# Altium footprint library Connectors.PcbLib: 60 footprints (part 3 of 4)
Each footprint in its own frame and in the unit in brackets; x right, y up, seen from the top. Pads: shape width x height; smd on the part's side, far side on the other; paste and mask are expansions set on the pad; w line width, h text height; cw(c..) or ccw(c..) is an arc to the next point about the centre after c.
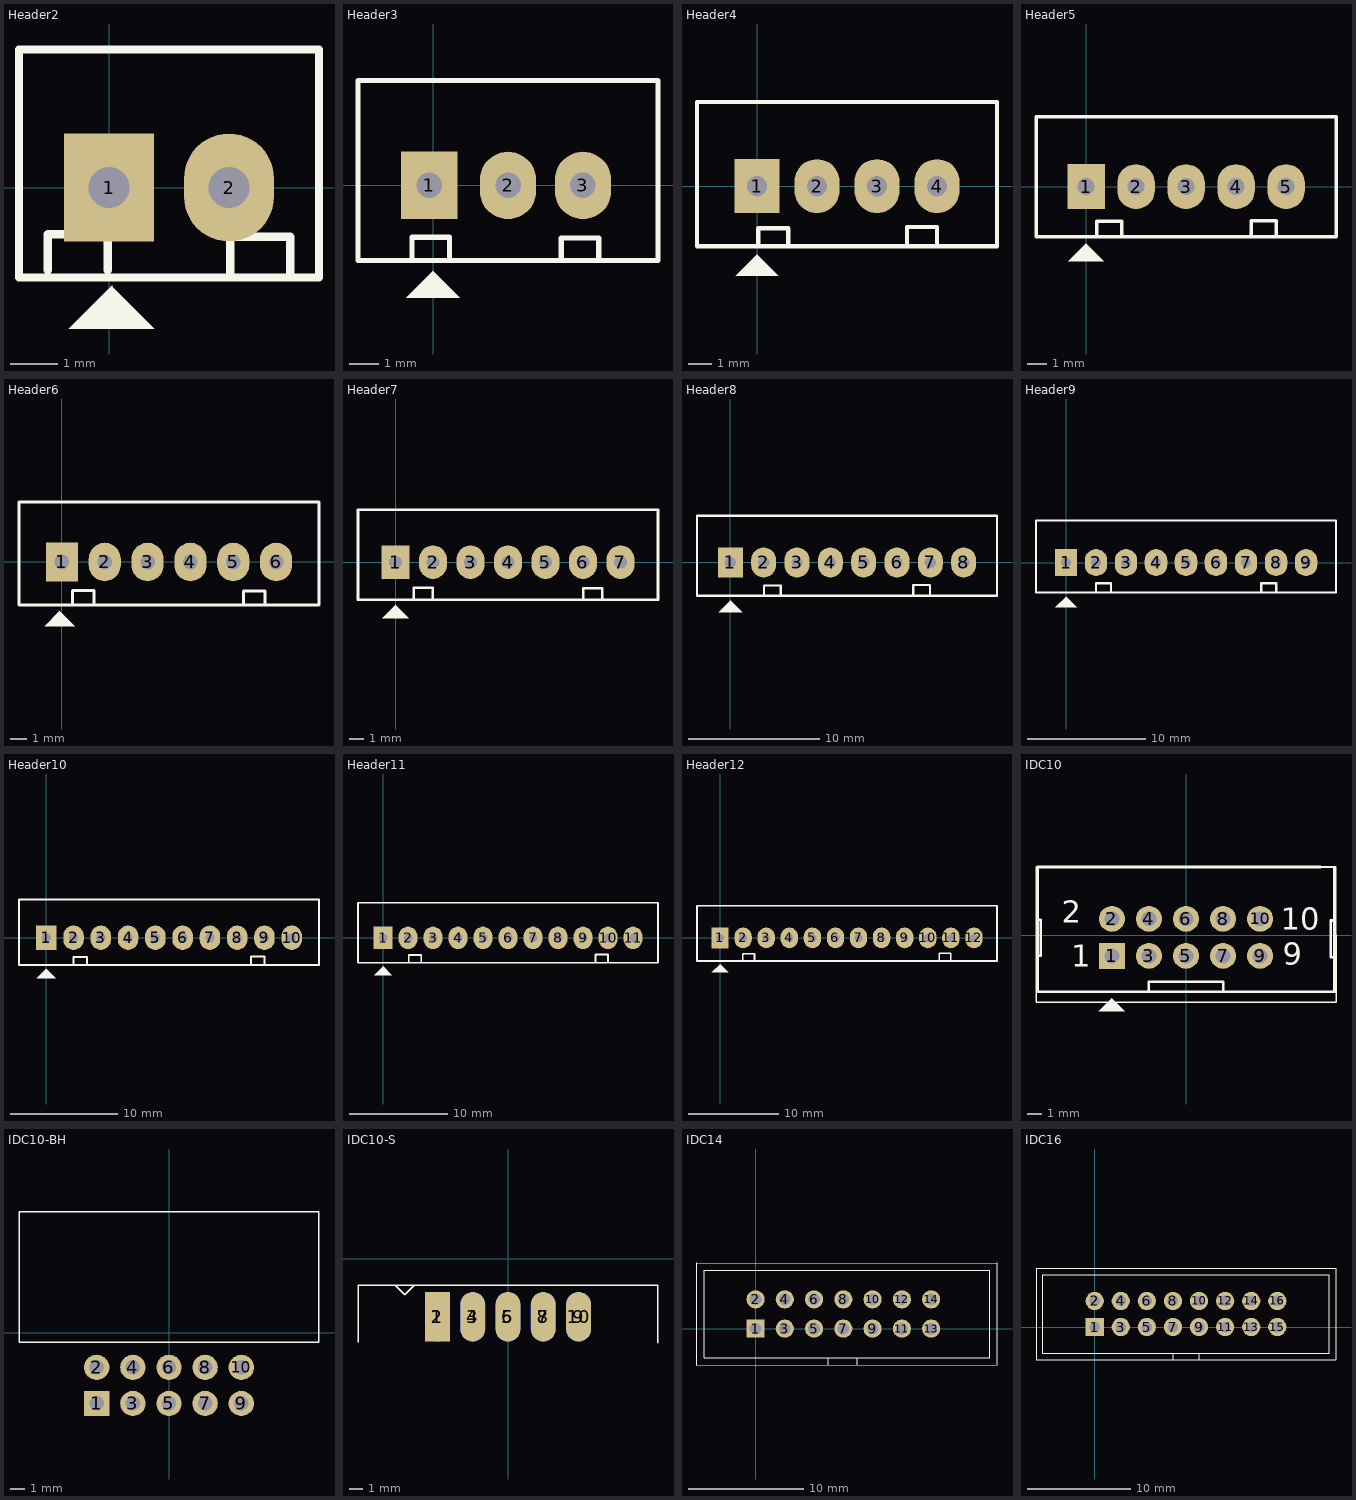
[diagram p2: the footprints below, top view; thin cyan lines are the x and y axes]

## Header2 [mil] "CON2"
height 200
pads (2):
  rect 75x90 hole 34: 1(0,0)
  oval 75x90 hole 34: 2(100,0)
Top Overlay:
  region: -33.5,-117.5 37.5,-117.5 2.5,-82.5 2.5,-81.5
  lines w7: -51,-69 -51,-39 -1,-39 -1,-69 ; 101,-71 101,-41 151,-41 151,-71 ; -75,-75 175,-75 175,115 -75,115 -75,-75
3D body "User Library-PCB HEADER (JST BxB-PH-K-S (VERTICAL)).STEP": height 236.22, standoff -75, extent -68.11,-70 168.11,107.17

## Header3 [mil] "CON 3"
height 200
pads (3):
  rect 75x90 hole 34: 1(-5,0)
  oval 75x90 hole 34: 2(100,0) 3(200,0)
Top Overlay:
  region: -35.5,-149.5 35.5,-149.5 0.5,-114.5 0.5,-113.5
  lines w7: -28,-99 -28,-69 22,-69 22,-99 ; 171,-100 171,-70 221,-70 221,-100 ; -100,-100 300,-100 300,0 300,140 -100,140 -100,-100
3D body "SW3dPS-jst-b3b-xh-a.STEP": height 275.59, standoff -133.86, extent -94.88,-90 294.88,136.38

## Header4 [mil] "CON4"
height 200
pads (4):
  rect 75x90 hole 34: 1(0,0)
  oval 75x90 hole 34: 2(100,0) 3(200,0) 4(300,0)
Top Overlay:
  region: -35.5,-149.5 35.5,-149.5 0.5,-114.5 0.5,-113.5
  lines w7: 2,-100 2,-70 52,-70 52,-100 ; 250,-98 250,-68 300,-68 300,-98 ; -100,-100 400,-100 400,0 400,140 -100,140 -100,-100
3D body "User Library-HEADER,JST,BxB-XH-A.STEP": height 275.59, standoff -133.86, extent -90,-90 398.19,136.38

## Header5 [mil] "CON5"
height 200
pads (5):
  rect 75x90 hole 34: 1(0,0)
  oval 75x90 hole 34: 2(100,0) 3(200,0) 4(300,0) 5(400,0)
Top Overlay:
  region: -35.5,-149.5 35.5,-149.5 0.5,-114.5 0.5,-113.5
  lines w7: 21,-99 21,-69 71,-69 71,-99 ; 330,-98 330,-68 380,-68 380,-98 ; -100,-100 -100,140 500,140 500,0 500,-100 -100,-100

## Header6 [mil] "CON6"
height 200
pads (6):
  rect 75x90 hole 34: 1(0,0)
  oval 75x90 hole 34: 2(100,0) 3(200,0) 4(300,0) 5(400,0) 6(500,0)
Top Overlay:
  region: -40.5,-149.5 30.5,-149.5 -4.5,-114.5 -4.5,-113.5
  lines w7: 25,-97 25,-67 75,-67 75,-97 ; 424,-98 424,-68 474,-68 474,-98 ; -100,-100 -100,140 600,140 600,0 600,-100 -100,-100

## Header7 [mil] "CON7"
height 200
pads (7):
  rect 75x90 hole 34: 1(0,0)
  oval 75x90 hole 34: 2(100,0) 3(200,0) 4(300,0) 5(400,0) 6(500,0) 7(600,0)
Top Overlay:
  region: -35.5,-149.5 35.5,-149.5 0.5,-114.5 0.5,-113.5
  lines w7: 49,-98 49,-68 99,-68 99,-98 ; 501,-99 501,-69 551,-69 551,-99 ; -100,-100 -100,140 700,140 700,0 700,-100 -100,-100

## Header8 [mil] "CON8"
height 200
pads (8):
  rect 75x90 hole 34: 1(0,0)
  oval 75x90 hole 34: 2(100,0) 3(200,0) 4(300,0) 5(400,0) 6(500,0) 7(600,0) 8(700,0)
Top Overlay:
  region: -35.5,-149.5 35.5,-149.5 0.5,-114.5 0.5,-113.5
  lines w7: 101,-99 101,-69 151,-69 151,-99 ; 549,-98 549,-68 599,-68 599,-98 ; -100,-100 800,-100 800,0 800,140 -100,140 -100,-100

## Header9 [mil] "CON9"
height 200
pads (9):
  rect 75x90 hole 34: 1(0,0)
  oval 75x90 hole 34: 2(100,0) 3(200,0) 4(300,0) 5(400,0) 6(500,0) 7(600,0) 8(700,0) 9(800,0)
Top Overlay:
  region: -35.5,-149.5 35.5,-149.5 0.5,-114.5 0.5,-113.5
  lines w7: 100,-99 100,-69 150,-69 150,-99 ; 651,-99 651,-69 701,-69 701,-99 ; -100,-100 -100,140 900,140 900,0 900,-100 -100,-100

## Header10 [mil] "CON10"
height 200
pads (10):
  rect 75x90 hole 34: 1(0,0)
  oval 75x90 hole 34: 2(100,0) 3(200,0) 4(300,0) 5(400,0) 6(500,0) 7(600,0) 8(700,0) 9(800,0) 10(900,0)
Top Overlay:
  region: -35.5,-149.5 35.5,-149.5 0.5,-114.5 0.5,-113.5
  lines w7: 100,-100 100,-70 150,-70 150,-100 ; 750,-99 750,-69 800,-69 800,-99 ; -100,-100 -100,140 1000,140 1000,0 1000,-100 -100,-100

## Header11 [mil] "CON11"
height 200
pads (11):
  rect 75x90 hole 34: 1(0,0)
  oval 75x90 hole 34: 2(100,0) 3(200,0) 4(300,0) 5(400,0) 6(500,0) 7(600,0) 8(700,0) 9(800,0) 10(900,0) 11(1000,0)
Top Overlay:
  region: -35.5,-149.5 35.5,-149.5 0.5,-114.5 0.5,-113.5
  lines w7: 103,-99 103,-69 153,-69 153,-99 ; 850,-97 850,-67 900,-67 900,-97 ; -100,-100 -100,140 1100,140 1100,0 1100,-100 -100,-100

## Header12 [mil] "CON12"
height 200
pads (12):
  rect 75x90 hole 34: 1(0,0)
  oval 75x90 hole 34: 2(100,0) 3(200,0) 4(300,0) 5(400,0) 6(500,0) 7(600,0) 8(700,0) 9(800,0) 10(900,0) 11(1000,0) 12(1100,0)
Top Overlay:
  region: -35.5,-149.5 35.5,-149.5 0.5,-114.5 0.5,-113.5
  lines w7: 99,-99 99,-69 149,-69 149,-99 ; 950,-97 950,-67 1000,-67 1000,-97 ; -100,-100 1200,-100 1200,0 1200,140 -100,140 -100,-100

## IDC10 [mil]
pads (10):
  rect 70x70 hole 40: 1(-200,-55)
  round 70 hole 40: 2(-200,45) 3(-100,-55) 4(-100,45) 5(0,-55) 6(0,45) 7(100,-55) 8(100,45) 9(200,-55) 10(200,45)
Top Overlay:
  region: -200,-170 -235,-205 -165,-205
  lines w4: -405,-180 -405,186 405,186 405,-180 -405,-180
  lines w5: 362.79,185 400,185 400,140 401,140
  lines w7: -400.79,-55.98 -399.8,-55 -391.93,-55 -391.93,42.44 -400.79,42.44 ; -100.59,-151 -100.59,-125 100.2,-125 100.2,-152 ; 398.56,-151.44 401,-149 ; 401,-59 391,-59 391,40.41 401,40.41 ; 402,-152.44 -400.79,-152.44 -400.79,185 ; -400.79,185 362.79,185 -400.79,185 ; 401,-149 401,146 401,-149
  text "10" at 256,16 h60
  text "9" at 261,-79 h60
  text "2" at -335,35 h60
  text "1" at -309.25,-84.53 h60
3D body "User Library-IDC-10M.STEP": height 366.14, standoff -122.05, extent -399.6,-178.23 399.61,180.04

## IDC10-BH [mil]
pads (10):
  rect 70x70 hole 40: 1(-200,-195)
  round 70 hole 40: 2(-200,-95) 3(-100,-195) 4(-100,-95) 5(0,-195) 6(0,-95) 7(100,-195) 8(100,-95) 9(200,-195) 10(200,-95)
Top Overlay:
  lines w4: -415,-25 415,-25 415,335 -415,335 -415,-25
3D body "User Library-IDC Socket Male 10pin Angled THT Goldplated 2_54mm.step": height 353.54, standoff -93.31, extent -412.2,-203.86 412.2,330

## IDC10-S [mil]
pads (10):
  rect 70x140 smd: 1(-200,-165)
  oval 70x140 smd far side: 2(-200,-165) 4(-100,-165) 6(0,-165) 8(100,-165) 10(200,-165)
  oval 70x140 smd: 3(-100,-165) 5(0,-165) 7(100,-165) 9(200,-165)
Top Overlay:
  lines w4: -319,-75 -292,-102 -265,-75 ; -425,-237 -425,-75 425,-75 425,-239 ; -425,-237 -425,-237 ; 425,-239 425,-239
3D body: height 150, standoff -150, extent -424.5,-67.5 425,18
3D body: height 150, standoff 120, extent -425.5,-67.5 425.5,275.5
3D body: height 150, standoff -150, extent -424.5,-67.5 -386,276
3D body: height 150, standoff -150, extent -424.5,-67.5 425,18
3D body: height 150, standoff -150, extent 386.5,-67.5 425,276
3D body: height 150, standoff 120, extent -424.5,-67.5 425,276
3D body: height 30, standoff 10, extent 187.5,-237.5 212.5,236.5
3D body: height 30, standoff 10, extent 87.5,-237.5 112.5,236.5
3D body: height 30, standoff 10, extent -12.5,-237.5 12.5,236.5
3D body: height 30, standoff 10, extent -112.5,-237.5 -87.5,236.5
3D body: height 30, standoff 10, extent -212.5,-237.5 -187.5,236.5
3D body: height 30, standoff 10, extent -212.5,-237.5 -187.5,236.5
3D body: height 30, standoff 10, extent -112.5,-237.5 -87.5,236.5
3D body: height 30, standoff 10, extent -12.5,-237.5 12.5,236.5
3D body: height 30, standoff 10, extent 87.5,-237.5 112.5,236.5
3D body: height 30, standoff 10, extent 187.5,-237.5 212.5,236.5
3D body: height 151, standoff 150, extent -227.75,142 -175.25,257
3D body: height 150, standoff -150, extent 386.5,-67.5 425,276
3D body: height 150, standoff -150, extent -424.5,-67.5 -386,276

## IDC14 [mil]
pads (14):
  rect 62x62 hole 40: 1(0,0)
  round 62 hole 40: 2(0,100) 3(100,0) 4(100,100) 5(200,0) 6(200,100) 7(300,0) 8(300,100) 9(400,0) 10(400,100) 11(500,0) 12(500,100) 13(600,0) 14(600,100)
Top Overlay:
  lines w4: 248,-125 248,-100 ; 348,-125 348,-100 ; 824,224 -200,225 -200,-125 825,-124 ; 825,-125 825,225 ; -175,-100 300,-100 800,-100 800,200 -175,200 -175,-100
3D body: height 358.27, standoff 0, extent -201.5,-125 824.5,225
3D body: height 102.36, standoff 0, extent -200.5,-125 825,225
3D body: height 300, standoff -120, extent -12.5,87.5 12.5,112.5
3D body: height 300, standoff -120, extent 87.5,87.5 112.5,112.5
3D body: height 300, standoff -120, extent 187.5,87.5 212.5,112.5
3D body: height 300, standoff -120, extent 287.5,87.5 312.5,112.5
3D body: height 300, standoff -120, extent 387.5,87.5 412.5,112.5
3D body: height 300, standoff -120, extent 387.5,-12.5 412.5,12.5
3D body: height 300, standoff -120, extent 287.5,-12.5 312.5,12.5
3D body: height 300, standoff -120, extent 187.5,-12.5 212.5,12.5
3D body: height 300, standoff -120, extent 87.5,-12.5 112.5,12.5
3D body: height 300, standoff -120, extent -12.5,-12.5 12.5,12.5
3D body: height 300, standoff -120, extent 487.5,-12.5 512.5,12.5
3D body: height 300, standoff -120, extent 487.5,87.5 512.5,112.5
3D body: height 300, standoff -120, extent 587.5,-12.5 612.5,12.5
3D body: height 300, standoff -120, extent 587.5,87.5 612.5,112.5

## IDC16 [mil]
pads (16):
  rect 70x70 hole 40: 1(0,0)
  round 70 hole 40: 2(0,100) 3(100,0) 4(100,100) 5(200,0) 6(200,100) 7(300,0) 8(300,100) 9(400,0) 10(400,100) 11(500,0) 12(500,100) 13(600,0) 14(600,100) 15(700,0) 16(700,100)
Top Overlay:
  lines w4: 300,-125 300,-100 ; 400,-125 400,-100 ; -225,-125 925,-125 925,225 -225,225 -225,-125 ; -200,-100 -200,200 900,200 900,-100 -200,-100
3D body: height 358.27, standoff 0, extent -224.5,-125 925.5,225
3D body: height 102.36, standoff 0, extent -225,-125 924.5,225
3D body: height 300, standoff -120, extent -12.5,87.5 12.5,112.5
3D body: height 300, standoff -120, extent 87.5,87.5 112.5,112.5
3D body: height 300, standoff -120, extent 187.5,87.5 212.5,112.5
3D body: height 300, standoff -120, extent 287.5,87.5 312.5,112.5
3D body: height 300, standoff -120, extent 387.5,87.5 412.5,112.5
3D body: height 300, standoff -120, extent 387.5,-12.5 412.5,12.5
3D body: height 300, standoff -120, extent 287.5,-12.5 312.5,12.5
3D body: height 300, standoff -120, extent 187.5,-12.5 212.5,12.5
3D body: height 300, standoff -120, extent 87.5,-12.5 112.5,12.5
3D body: height 300, standoff -120, extent -12.5,-12.5 12.5,12.5
3D body: height 300, standoff -120, extent 487.5,-12.5 512.5,12.5
3D body: height 300, standoff -120, extent 487.5,87.5 512.5,112.5
3D body: height 300, standoff -120, extent 587.5,-12.5 612.5,12.5
3D body: height 300, standoff -120, extent 587.5,87.5 612.5,112.5
3D body: height 300, standoff -120, extent 687.5,87.5 712.5,112.5
3D body: height 300, standoff -120, extent 687.5,-12.5 712.5,12.5